# Altium schematic symbol library Regulator_Linear.SchLib: 1452 symbols (part 1 of 10) (continued)
## AP2127N-2.5
designator *  value AP2127N-2.5
ki_keywords: linear regulator ldo fixed positive; ki_description: 300mA low dropout linear regulator, shutdown pin, 2.5V-6V input voltage, 2.5V fixed positive output, SOT-23 package; ki_fp_filters: SOT?23*; Footprint: Package_TO_SOT_SMD:SOT-23; Supplier: https://www.diodes.com/assets/Datasheets/AP2127.pdf
footprint SOT-23
pins: 1 GND (power), 2 VO (power), 3 VI (power)

## AP2127N-2.8
designator *  value AP2127N-2.8
ki_keywords: linear regulator ldo fixed positive; ki_description: 300mA low dropout linear regulator, shutdown pin, 2.5V-6V input voltage, 2.8V fixed positive output, SOT-23 package; ki_fp_filters: SOT?23*; Footprint: Package_TO_SOT_SMD:SOT-23; Supplier: https://www.diodes.com/assets/Datasheets/AP2127.pdf
footprint SOT-23
pins: 1 GND (power), 2 VO (power), 3 VI (power)

## AP2127N-3.0
designator *  value AP2127N-3.0
ki_keywords: linear regulator ldo fixed positive; ki_description: 300mA low dropout linear regulator, shutdown pin, 2.5V-6V input voltage, 3.0V fixed positive output, SOT-23 package; ki_fp_filters: SOT?23*; Footprint: Package_TO_SOT_SMD:SOT-23; Supplier: https://www.diodes.com/assets/Datasheets/AP2127.pdf
footprint SOT-23
pins: 1 GND (power), 2 VO (power), 3 VI (power)

## AP2127N-3.3
designator *  value AP2127N-3.3
ki_keywords: linear regulator ldo fixed positive; ki_description: 300mA low dropout linear regulator, shutdown pin, 2.5V-6V input voltage, 3.3V fixed positive output, SOT-23 package; ki_fp_filters: SOT?23*; Footprint: Package_TO_SOT_SMD:SOT-23; Supplier: https://www.diodes.com/assets/Datasheets/AP2127.pdf
footprint SOT-23
pins: 1 GND (power), 2 VO (power), 3 VI (power)

## AP2127R-3.3
designator *  value AP2127R-3.3
ki_keywords: linear regulator ldo fixed positive; ki_description: 300mA low dropout linear regulator, shutdown pin, 2.5V-6V input voltage, 3.3V fixed positive output, SOT-89 package; ki_fp_filters: SOT?89*; Footprint: Package_TO_SOT_SMD:SOT-89-3; Supplier: https://www.diodes.com/assets/Datasheets/AP2127.pdf
footprint SOT-89-3
pins: 1 GND (power), 2 VI (power), 3 VO (power)

## AP2204K-1.5
designator *  value AP2204K-1.5
ki_keywords: linear regulator ldo fixed positive; ki_description: 150mA low dropout linear regulator, wide input voltage range, 1.5V fixed positive output, SOT-23-5; ki_fp_filters: SOT?23?5*; Footprint: Package_TO_SOT_SMD:SOT-23-5; Supplier: https://www.diodes.com/assets/Datasheets/AP2204.pdf
footprint SOT-23-5
pins: 1 VIN (power), 2 GND (power), 3 EN (in), 4 NC (in) hidden, 5 VOUT (power)

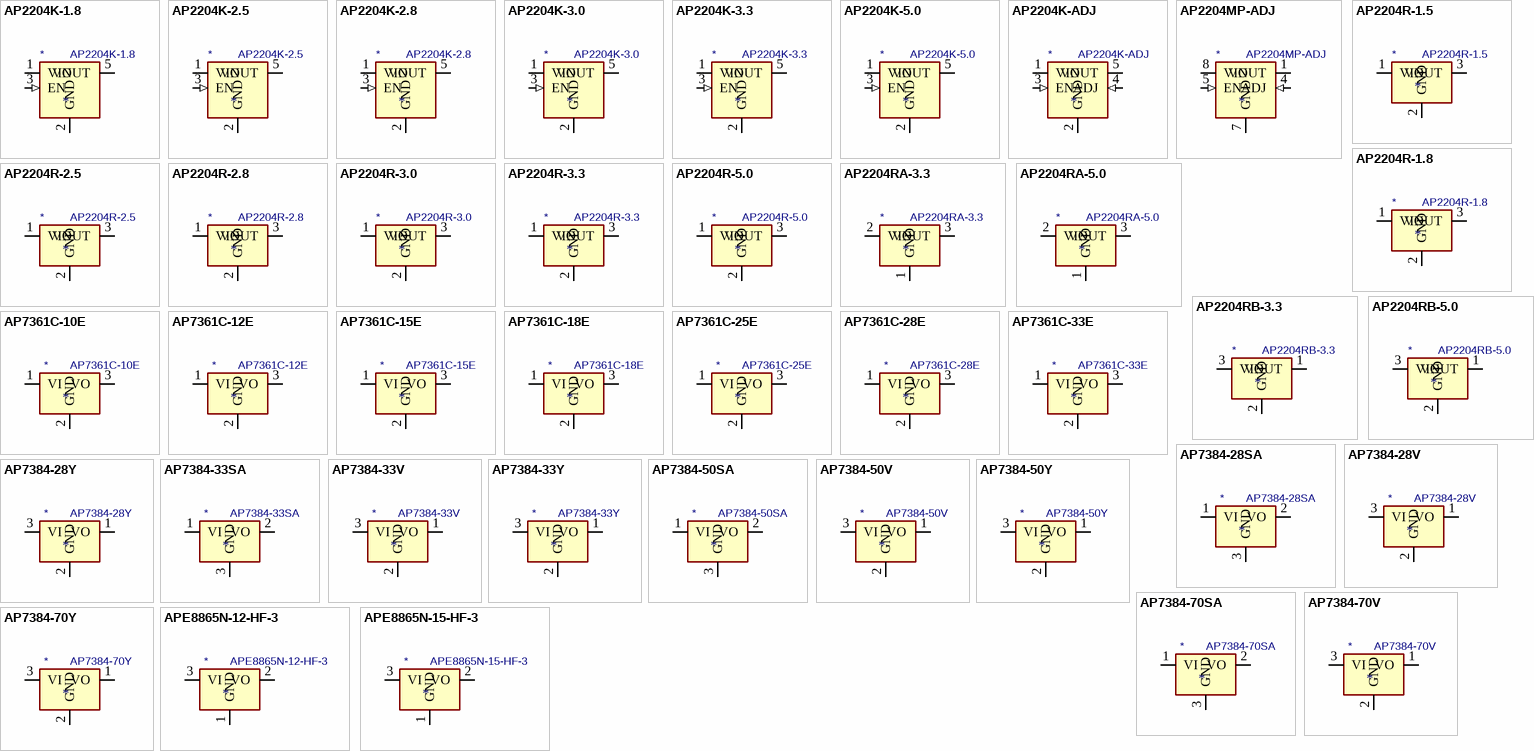
[diagram p2: symbols AP2204K-1.8 to APE8865N-15-HF-3]

## AP2204K-1.8
designator *  value AP2204K-1.8
ki_keywords: linear regulator ldo fixed positive; ki_description: 150mA low dropout linear regulator, wide input voltage range, 1.8V fixed positive output, SOT-23-5; ki_fp_filters: SOT?23?5*; Footprint: Package_TO_SOT_SMD:SOT-23-5; Supplier: https://www.diodes.com/assets/Datasheets/AP2204.pdf
footprint SOT-23-5
pins: 1 VIN (power), 2 GND (power), 3 EN (in), 4 NC (in) hidden, 5 VOUT (power)

## AP2204K-2.5
designator *  value AP2204K-2.5
ki_keywords: linear regulator ldo fixed positive; ki_description: 150mA low dropout linear regulator, wide input voltage range, 2.5V fixed positive output, SOT-23-5; ki_fp_filters: SOT?23?5*; Footprint: Package_TO_SOT_SMD:SOT-23-5; Supplier: https://www.diodes.com/assets/Datasheets/AP2204.pdf
footprint SOT-23-5
pins: 1 VIN (power), 2 GND (power), 3 EN (in), 4 NC (in) hidden, 5 VOUT (power)

## AP2204K-2.8
designator *  value AP2204K-2.8
ki_keywords: linear regulator ldo fixed positive; ki_description: 150mA low dropout linear regulator, wide input voltage range, 2.8V fixed positive output, SOT-23-5; ki_fp_filters: SOT?23?5*; Footprint: Package_TO_SOT_SMD:SOT-23-5; Supplier: https://www.diodes.com/assets/Datasheets/AP2204.pdf
footprint SOT-23-5
pins: 1 VIN (power), 2 GND (power), 3 EN (in), 4 NC (in) hidden, 5 VOUT (power)

## AP2204K-3.0
designator *  value AP2204K-3.0
ki_keywords: linear regulator ldo fixed positive; ki_description: 150mA low dropout linear regulator, wide input voltage range, 3.0V fixed positive output, SOT-23-5; ki_fp_filters: SOT?23?5*; Footprint: Package_TO_SOT_SMD:SOT-23-5; Supplier: https://www.diodes.com/assets/Datasheets/AP2204.pdf
footprint SOT-23-5
pins: 1 VIN (power), 2 GND (power), 3 EN (in), 4 NC (in) hidden, 5 VOUT (power)

## AP2204K-3.3
designator *  value AP2204K-3.3
ki_keywords: linear regulator ldo fixed positive; ki_description: 150mA low dropout linear regulator, wide input voltage range, 3.3V fixed positive output, SOT-23-5; ki_fp_filters: SOT?23?5*; Footprint: Package_TO_SOT_SMD:SOT-23-5; Supplier: https://www.diodes.com/assets/Datasheets/AP2204.pdf
footprint SOT-23-5
pins: 1 VIN (power), 2 GND (power), 3 EN (in), 4 NC (in) hidden, 5 VOUT (power)

## AP2204K-5.0
designator *  value AP2204K-5.0
ki_keywords: linear regulator ldo fixed positive; ki_description: 150mA low dropout linear regulator, wide input voltage range, 5.0V fixed positive output, SOT-23-5; ki_fp_filters: SOT?23?5*; Footprint: Package_TO_SOT_SMD:SOT-23-5; Supplier: https://www.diodes.com/assets/Datasheets/AP2204.pdf
footprint SOT-23-5
pins: 1 VIN (power), 2 GND (power), 3 EN (in), 4 NC (in) hidden, 5 VOUT (power)

## AP2204K-ADJ
designator *  value AP2204K-ADJ
ki_keywords: linear regulator ldo adjustable positive; ki_description: 150mA low dropout adjustable linear regulator, wide input voltage range, SOT-23-5 package; ki_fp_filters: SOT?23?5*; Footprint: Package_TO_SOT_SMD:SOT-23-5; Supplier: https://www.diodes.com/assets/Datasheets/AP2204.pdf
footprint SOT-23-5
pins: 1 VIN (power), 2 GND (power), 3 EN (in), 4 ADJ (in), 5 VOUT (power)

## AP2204MP-ADJ
designator *  value AP2204MP-ADJ
ki_keywords: linear regulator ldo adjustable positive; ki_description: 150mA low dropout adjustable linear regulator, wide input voltage range, PSOP-8 package; ki_fp_filters: Diodes*PSOP*; Footprint: Package_SO:Diodes_PSOP-8; Supplier: https://www.diodes.com/assets/Datasheets/AP2204.pdf
footprint Diodes_PSOP-8
pins: 1 VOUT (power), 2 NC (in) hidden, 3 NC (in) hidden, 4 ADJ (in), 5 EN (in), 6 NC (in) hidden, 7 GND (power), 8 VIN (power), 9 GND hidden

## AP2204R-1.5
designator *  value AP2204R-1.5
ki_keywords: linear regulator ldo fixed positive; ki_description: 150mA low dropout linear regulator, wide input voltage range, 1.5V fixed positive output, SOT-89-3 package; ki_fp_filters: SOT?89*; Footprint: Package_TO_SOT_SMD:SOT-89-3; Supplier: https://www.diodes.com/assets/Datasheets/AP2204.pdf
footprint SOT-89-3
pins: 1 VIN (power), 2 GND (power), 3 VOUT (power)

## AP2204R-1.8
designator *  value AP2204R-1.8
ki_keywords: linear regulator ldo fixed positive; ki_description: 150mA low dropout linear regulator, wide input voltage range, 1.8V fixed positive output, SOT-89-3 package; ki_fp_filters: SOT?89*; Footprint: Package_TO_SOT_SMD:SOT-89-3; Supplier: https://www.diodes.com/assets/Datasheets/AP2204.pdf
footprint SOT-89-3
pins: 1 VIN (power), 2 GND (power), 3 VOUT (power)

## AP2204R-2.5
designator *  value AP2204R-2.5
ki_keywords: linear regulator ldo fixed positive; ki_description: 150mA low dropout linear regulator, wide input voltage range, 2.5V fixed positive output, SOT-89-3 package; ki_fp_filters: SOT?89*; Footprint: Package_TO_SOT_SMD:SOT-89-3; Supplier: https://www.diodes.com/assets/Datasheets/AP2204.pdf
footprint SOT-89-3
pins: 1 VIN (power), 2 GND (power), 3 VOUT (power)

## AP2204R-2.8
designator *  value AP2204R-2.8
ki_keywords: linear regulator ldo fixed positive; ki_description: 150mA low dropout linear regulator, wide input voltage range, 2.8V fixed positive output, SOT-89-3 package; ki_fp_filters: SOT?89*; Footprint: Package_TO_SOT_SMD:SOT-89-3; Supplier: https://www.diodes.com/assets/Datasheets/AP2204.pdf
footprint SOT-89-3
pins: 1 VIN (power), 2 GND (power), 3 VOUT (power)

## AP2204R-3.0
designator *  value AP2204R-3.0
ki_keywords: linear regulator ldo fixed positive; ki_description: 150mA low dropout linear regulator, wide input voltage range, 3.0V fixed positive output, SOT-89-3 package; ki_fp_filters: SOT?89*; Footprint: Package_TO_SOT_SMD:SOT-89-3; Supplier: https://www.diodes.com/assets/Datasheets/AP2204.pdf
footprint SOT-89-3
pins: 1 VIN (power), 2 GND (power), 3 VOUT (power)

## AP2204R-3.3
designator *  value AP2204R-3.3
ki_keywords: linear regulator ldo fixed positive; ki_description: 150mA low dropout linear regulator, wide input voltage range, 3.3V fixed positive output, SOT-89-3 package; ki_fp_filters: SOT?89*; Footprint: Package_TO_SOT_SMD:SOT-89-3; Supplier: https://www.diodes.com/assets/Datasheets/AP2204.pdf
footprint SOT-89-3
pins: 1 VIN (power), 2 GND (power), 3 VOUT (power)

## AP2204R-5.0
designator *  value AP2204R-5.0
ki_keywords: linear regulator ldo fixed positive; ki_description: 150mA low dropout linear regulator, wide input voltage range, 5.0V fixed positive output, SOT-89-3 package; ki_fp_filters: SOT?89*; Footprint: Package_TO_SOT_SMD:SOT-89-3; Supplier: https://www.diodes.com/assets/Datasheets/AP2204.pdf
footprint SOT-89-3
pins: 1 VIN (power), 2 GND (power), 3 VOUT (power)

## AP2204RA-3.3
designator *  value AP2204RA-3.3
ki_keywords: linear regulator ldo fixed positive; ki_description: 150mA low dropout linear regulator, wide input voltage range, 3.3V fixed positive output, SOT-89-3 package; ki_fp_filters: SOT?89*; Footprint: Package_TO_SOT_SMD:SOT-89-3; Supplier: https://www.diodes.com/assets/Datasheets/AP2204.pdf
footprint SOT-89-3
pins: 1 GND (power), 2 VIN (power), 3 VOUT (power)

## AP2204RA-5.0
designator *  value AP2204RA-5.0
ki_keywords: linear regulator ldo fixed positive; ki_description: 150mA low dropout linear regulator, wide input voltage range, 5.0V fixed positive output, SOT-89-3 package; ki_fp_filters: SOT?89*; Footprint: Package_TO_SOT_SMD:SOT-89-3; Supplier: https://www.diodes.com/assets/Datasheets/AP2204.pdf
footprint SOT-89-3
pins: 1 GND (power), 2 VIN (power), 3 VOUT (power)

## AP2204RB-3.3
designator *  value AP2204RB-3.3
ki_keywords: linear regulator ldo fixed positive; ki_description: 150mA low dropout linear regulator, wide input voltage range, 3.3V fixed positive output, SOT-89-3 package; ki_fp_filters: SOT?89*; Footprint: Package_TO_SOT_SMD:SOT-89-3; Supplier: https://www.diodes.com/assets/Datasheets/AP2204.pdf
footprint SOT-89-3
pins: 1 VOUT (power), 2 GND (power), 3 VIN (power)

## AP2204RB-5.0
designator *  value AP2204RB-5.0
ki_keywords: linear regulator ldo fixed positive; ki_description: 150mA low dropout linear regulator, wide input voltage range, 5.0V fixed positive output, SOT-89-3 package; ki_fp_filters: SOT?89*; Footprint: Package_TO_SOT_SMD:SOT-89-3; Supplier: https://www.diodes.com/assets/Datasheets/AP2204.pdf
footprint SOT-89-3
pins: 1 VOUT (power), 2 GND (power), 3 VIN (power)

## AP7361C-10E
designator *  value AP7361C-10E
ki_keywords: linear regulator ldo fixed positive; ki_description: 1A Low Dropout regulator, positive, 1.0V fixed output, SOT-223; ki_fp_filters: SOT?223*; Footprint: Package_TO_SOT_SMD:SOT-223-3_TabPin2; Supplier: https://www.diodes.com/assets/Datasheets/AP7361C.pdf
footprint SOT-223-3_TabPin2
pins: 1 VI (power), 2 GND (power), 3 VO (power)

## AP7361C-12E
designator *  value AP7361C-12E
ki_keywords: linear regulator ldo fixed positive; ki_description: 1A Low Dropout regulator, positive, 1.2V fixed output, SOT-223; ki_fp_filters: SOT?223*; Footprint: Package_TO_SOT_SMD:SOT-223-3_TabPin2; Supplier: https://www.diodes.com/assets/Datasheets/AP7361C.pdf
footprint SOT-223-3_TabPin2
pins: 1 VI (power), 2 GND (power), 3 VO (power)

## AP7361C-15E
designator *  value AP7361C-15E
ki_keywords: linear regulator ldo fixed positive; ki_description: 1A Low Dropout regulator, positive, 1.5V fixed output, SOT-223; ki_fp_filters: SOT?223*; Footprint: Package_TO_SOT_SMD:SOT-223-3_TabPin2; Supplier: https://www.diodes.com/assets/Datasheets/AP7361C.pdf
footprint SOT-223-3_TabPin2
pins: 1 VI (power), 2 GND (power), 3 VO (power)

## AP7361C-18E
designator *  value AP7361C-18E
ki_keywords: linear regulator ldo fixed positive; ki_description: 1A Low Dropout regulator, positive, 1.8V fixed output, SOT-223; ki_fp_filters: SOT?223*; Footprint: Package_TO_SOT_SMD:SOT-223-3_TabPin2; Supplier: https://www.diodes.com/assets/Datasheets/AP7361C.pdf
footprint SOT-223-3_TabPin2
pins: 1 VI (power), 2 GND (power), 3 VO (power)

## AP7361C-25E
designator *  value AP7361C-25E
ki_keywords: linear regulator ldo fixed positive; ki_description: 1A Low Dropout regulator, positive, 2.5V fixed output, SOT-223; ki_fp_filters: SOT?223*; Footprint: Package_TO_SOT_SMD:SOT-223-3_TabPin2; Supplier: https://www.diodes.com/assets/Datasheets/AP7361C.pdf
footprint SOT-223-3_TabPin2
pins: 1 VI (power), 2 GND (power), 3 VO (power)

## AP7361C-28E
designator *  value AP7361C-28E
ki_keywords: linear regulator ldo fixed positive; ki_description: 1A Low Dropout regulator, positive, 2.8V fixed output, SOT-223; ki_fp_filters: SOT?223*; Footprint: Package_TO_SOT_SMD:SOT-223-3_TabPin2; Supplier: https://www.diodes.com/assets/Datasheets/AP7361C.pdf
footprint SOT-223-3_TabPin2
pins: 1 VI (power), 2 GND (power), 3 VO (power)

## AP7361C-33E
designator *  value AP7361C-33E
ki_keywords: linear regulator ldo fixed positive; ki_description: 1A Low Dropout regulator, positive, 3.3V fixed output, SOT-223; ki_fp_filters: SOT?223*; Footprint: Package_TO_SOT_SMD:SOT-223-3_TabPin2; Supplier: https://www.diodes.com/assets/Datasheets/AP7361C.pdf
footprint SOT-223-3_TabPin2
pins: 1 VI (power), 2 GND (power), 3 VO (power)

## AP7384-28SA
designator *  value AP7384-28SA
ki_keywords: 50mA LDO Regulator Fixed Positive; ki_description: 50mA Low Dropout Voltage Regulator, Fixed Output 2.8V, Wide Input Voltage Range 40V, SOT-23; ki_fp_filters: SOT?23*; Footprint: Package_TO_SOT_SMD:SOT-23; Supplier: https://www.diodes.com/assets/Datasheets/AP7384.pdf
footprint SOT-23
pins: 1 VI (power), 2 VO (power), 3 GND (power)

## AP7384-28V
designator *  value AP7384-28V
ki_keywords: 50mA LDO Regulator Fixed Positive; ki_description: 50mA Low Dropout Voltage Regulator, Fixed Output 2.8V, Wide Input Voltage Range 40V, TO-92; ki_fp_filters: TO?92*; Footprint: Package_TO_SOT_THT:TO-92_Inline_Wide; Supplier: https://www.diodes.com/assets/Datasheets/AP7384.pdf
footprint TO-92_Inline_Wide
pins: 1 VO (power), 2 GND (power), 3 VI (power)

## AP7384-28Y
designator *  value AP7384-28Y
ki_keywords: 50mA LDO Regulator Fixed Positive; ki_description: 50mA Low Dropout Voltage Regulator, Fixed Output 2.8V, Wide Input Voltage Range 40V, SOT-89-3; ki_fp_filters: SOT?89?3*; Footprint: Package_TO_SOT_SMD:SOT-89-3; Supplier: https://www.diodes.com/assets/Datasheets/AP7384.pdf
footprint SOT-89-3
pins: 1 VO (power), 2 GND (power), 3 VI (power)

## AP7384-33SA
designator *  value AP7384-33SA
ki_keywords: 50mA LDO Regulator Fixed Positive; ki_description: 50mA Low Dropout Voltage Regulator, Fixed Output 3.3V, Wide Input Voltage Range 40V, SOT-23; ki_fp_filters: SOT?23*; Footprint: Package_TO_SOT_SMD:SOT-23; Supplier: https://www.diodes.com/assets/Datasheets/AP7384.pdf
footprint SOT-23
pins: 1 VI (power), 2 VO (power), 3 GND (power)

## AP7384-33V
designator *  value AP7384-33V
ki_keywords: 50mA LDO Regulator Fixed Positive; ki_description: 50mA Low Dropout Voltage Regulator, Fixed Output 3.3V, Wide Input Voltage Range 40V, TO-92; ki_fp_filters: TO?92*; Footprint: Package_TO_SOT_THT:TO-92_Inline_Wide; Supplier: https://www.diodes.com/assets/Datasheets/AP7384.pdf
footprint TO-92_Inline_Wide
pins: 1 VO (power), 2 GND (power), 3 VI (power)

## AP7384-33Y
designator *  value AP7384-33Y
ki_keywords: 50mA LDO Regulator Fixed Positive; ki_description: 50mA Low Dropout Voltage Regulator, Fixed Output 3.3V, Wide Input Voltage Range 40V, SOT-89-3; ki_fp_filters: SOT?89?3*; Footprint: Package_TO_SOT_SMD:SOT-89-3; Supplier: https://www.diodes.com/assets/Datasheets/AP7384.pdf
footprint SOT-89-3
pins: 1 VO (power), 2 GND (power), 3 VI (power)

## AP7384-50SA
designator *  value AP7384-50SA
ki_keywords: 50mA LDO Regulator Fixed Positive; ki_description: 50mA Low Dropout Voltage Regulator, Fixed Output 5V, Wide Input Voltage Range 40V, SOT-23; ki_fp_filters: SOT?23*; Footprint: Package_TO_SOT_SMD:SOT-23; Supplier: https://www.diodes.com/assets/Datasheets/AP7384.pdf
footprint SOT-23
pins: 1 VI (power), 2 VO (power), 3 GND (power)

## AP7384-50V
designator *  value AP7384-50V
ki_keywords: 50mA LDO Regulator Fixed Positive; ki_description: 50mA Low Dropout Voltage Regulator, Fixed Output 5V, Wide Input Voltage Range 40V, TO-92; ki_fp_filters: TO?92*; Footprint: Package_TO_SOT_THT:TO-92_Inline_Wide; Supplier: https://www.diodes.com/assets/Datasheets/AP7384.pdf
footprint TO-92_Inline_Wide
pins: 1 VO (power), 2 GND (power), 3 VI (power)

## AP7384-50Y
designator *  value AP7384-50Y
ki_keywords: 50mA LDO Regulator Fixed Positive; ki_description: 50mA Low Dropout Voltage Regulator, Fixed Output 5V, Wide Input Voltage Range 40V, SOT-89-3; ki_fp_filters: SOT?89?3*; Footprint: Package_TO_SOT_SMD:SOT-89-3; Supplier: https://www.diodes.com/assets/Datasheets/AP7384.pdf
footprint SOT-89-3
pins: 1 VO (power), 2 GND (power), 3 VI (power)

## AP7384-70SA
designator *  value AP7384-70SA
ki_keywords: 50mA LDO Regulator Fixed Positive; ki_description: 50mA Low Dropout Voltage Regulator, Fixed Output 7V, Wide Input Voltage Range 40V, SOT-23; ki_fp_filters: SOT?23*; Footprint: Package_TO_SOT_SMD:SOT-23; Supplier: https://www.diodes.com/assets/Datasheets/AP7384.pdf
footprint SOT-23
pins: 1 VI (power), 2 VO (power), 3 GND (power)

## AP7384-70V
designator *  value AP7384-70V
ki_keywords: 50mA LDO Regulator Fixed Positive; ki_description: 50mA Low Dropout Voltage Regulator, Fixed Output 7V, Wide Input Voltage Range 40V, TO-92; ki_fp_filters: TO?92*; Footprint: Package_TO_SOT_THT:TO-92_Inline_Wide; Supplier: https://www.diodes.com/assets/Datasheets/AP7384.pdf
footprint TO-92_Inline_Wide
pins: 1 VO (power), 2 GND (power), 3 VI (power)

## AP7384-70Y
designator *  value AP7384-70Y
ki_keywords: 50mA LDO Regulator Fixed Positive; ki_description: 50mA Low Dropout Voltage Regulator, Fixed Output 7V, Wide Input Voltage Range 40V, SOT-89-3; ki_fp_filters: SOT?89?3*; Footprint: Package_TO_SOT_SMD:SOT-89-3; Supplier: https://www.diodes.com/assets/Datasheets/AP7384.pdf
footprint SOT-89-3
pins: 1 VO (power), 2 GND (power), 3 VI (power)

## APE8865N-12-HF-3
designator *  value APE8865N-12-HF-3
ki_keywords: 300mA LDO Regulator Fixed Positive; ki_description: 300mA Low Dropout Voltage Regulator, Fixed Output 1.2V, SOT-23; ki_fp_filters: SOT?23*; Footprint: Package_TO_SOT_SMD:SOT-23; Supplier: http://www.tme.eu/fr/Document/ced3461ed31ea70a3c416fb648e0cde7/APE8865-3.pdf
footprint SOT-23
pins: 1 GND (power), 2 VO (power), 3 VI (power)

## APE8865N-15-HF-3
designator *  value APE8865N-15-HF-3
ki_keywords: 300mA LDO Regulator Fixed Positive; ki_description: 300mA Low Dropout Voltage Regulator, Fixed Output 1.5V, SOT-23; ki_fp_filters: SOT?23*; Footprint: Package_TO_SOT_SMD:SOT-23; Supplier: http://www.tme.eu/fr/Document/ced3461ed31ea70a3c416fb648e0cde7/APE8865-3.pdf
footprint SOT-23
pins: 1 GND (power), 2 VO (power), 3 VI (power)

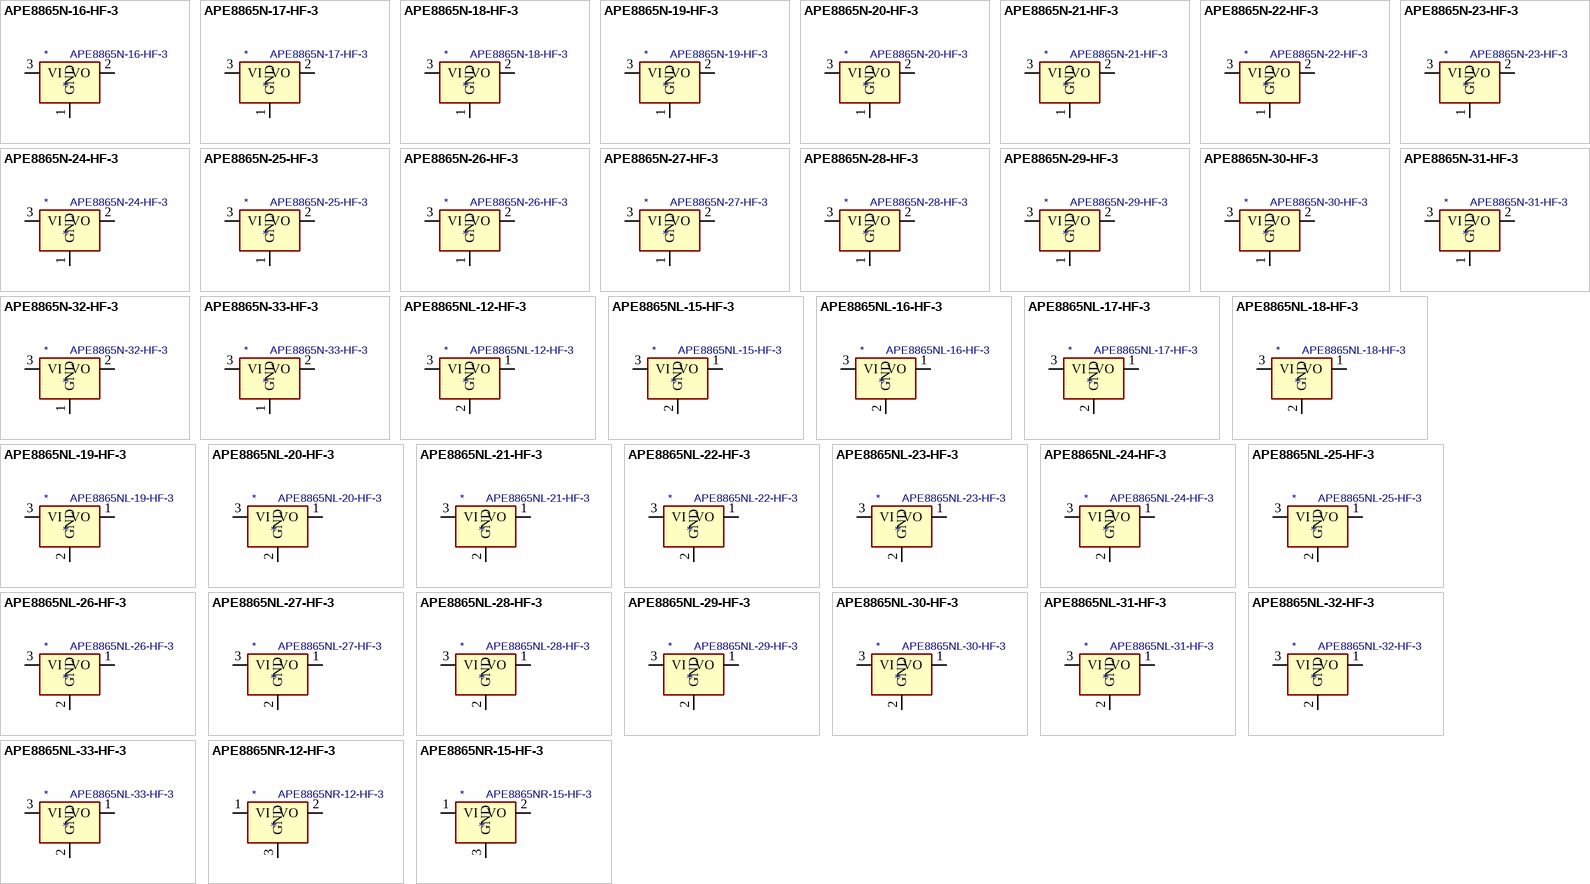
[diagram p3: symbols APE8865N-16-HF-3 to APE8865NR-15-HF-3]

## APE8865N-16-HF-3
designator *  value APE8865N-16-HF-3
ki_keywords: 300mA LDO Regulator Fixed Positive; ki_description: 300mA Low Dropout Voltage Regulator, Fixed Output 1.6V, SOT-23; ki_fp_filters: SOT?23*; Footprint: Package_TO_SOT_SMD:SOT-23; Supplier: http://www.tme.eu/fr/Document/ced3461ed31ea70a3c416fb648e0cde7/APE8865-3.pdf
footprint SOT-23
pins: 1 GND (power), 2 VO (power), 3 VI (power)

## APE8865N-17-HF-3
designator *  value APE8865N-17-HF-3
ki_keywords: 300mA LDO Regulator Fixed Positive; ki_description: 300mA Low Dropout Voltage Regulator, Fixed Output 1.7V, SOT-23; ki_fp_filters: SOT?23*; Footprint: Package_TO_SOT_SMD:SOT-23; Supplier: http://www.tme.eu/fr/Document/ced3461ed31ea70a3c416fb648e0cde7/APE8865-3.pdf
footprint SOT-23
pins: 1 GND (power), 2 VO (power), 3 VI (power)

## APE8865N-18-HF-3
designator *  value APE8865N-18-HF-3
ki_keywords: 300mA LDO Regulator Fixed Positive; ki_description: 300mA Low Dropout Voltage Regulator, Fixed Output 1.8V, SOT-23; ki_fp_filters: SOT?23*; Footprint: Package_TO_SOT_SMD:SOT-23; Supplier: http://www.tme.eu/fr/Document/ced3461ed31ea70a3c416fb648e0cde7/APE8865-3.pdf
footprint SOT-23
pins: 1 GND (power), 2 VO (power), 3 VI (power)

## APE8865N-19-HF-3
designator *  value APE8865N-19-HF-3
ki_keywords: 300mA LDO Regulator Fixed Positive; ki_description: 300mA Low Dropout Voltage Regulator, Fixed Output 1.9V, SOT-23; ki_fp_filters: SOT?23*; Footprint: Package_TO_SOT_SMD:SOT-23; Supplier: http://www.tme.eu/fr/Document/ced3461ed31ea70a3c416fb648e0cde7/APE8865-3.pdf
footprint SOT-23
pins: 1 GND (power), 2 VO (power), 3 VI (power)

## APE8865N-20-HF-3
designator *  value APE8865N-20-HF-3
ki_keywords: 300mA LDO Regulator Fixed Positive; ki_description: 300mA Low Dropout Voltage Regulator, Fixed Output 2.0V, SOT-23; ki_fp_filters: SOT?23*; Footprint: Package_TO_SOT_SMD:SOT-23; Supplier: http://www.tme.eu/fr/Document/ced3461ed31ea70a3c416fb648e0cde7/APE8865-3.pdf
footprint SOT-23
pins: 1 GND (power), 2 VO (power), 3 VI (power)

## APE8865N-21-HF-3
designator *  value APE8865N-21-HF-3
ki_keywords: 300mA LDO Regulator Fixed Positive; ki_description: 300mA Low Dropout Voltage Regulator, Fixed Output 2.1V, SOT-23; ki_fp_filters: SOT?23*; Footprint: Package_TO_SOT_SMD:SOT-23; Supplier: http://www.tme.eu/fr/Document/ced3461ed31ea70a3c416fb648e0cde7/APE8865-3.pdf
footprint SOT-23
pins: 1 GND (power), 2 VO (power), 3 VI (power)

## APE8865N-22-HF-3
designator *  value APE8865N-22-HF-3
ki_keywords: 300mA LDO Regulator Fixed Positive; ki_description: 300mA Low Dropout Voltage Regulator, Fixed Output 2.2V, SOT-23; ki_fp_filters: SOT?23*; Footprint: Package_TO_SOT_SMD:SOT-23; Supplier: http://www.tme.eu/fr/Document/ced3461ed31ea70a3c416fb648e0cde7/APE8865-3.pdf
footprint SOT-23
pins: 1 GND (power), 2 VO (power), 3 VI (power)

## APE8865N-23-HF-3
designator *  value APE8865N-23-HF-3
ki_keywords: 300mA LDO Regulator Fixed Positive; ki_description: 300mA Low Dropout Voltage Regulator, Fixed Output 2.3V, SOT-23; ki_fp_filters: SOT?23*; Footprint: Package_TO_SOT_SMD:SOT-23; Supplier: http://www.tme.eu/fr/Document/ced3461ed31ea70a3c416fb648e0cde7/APE8865-3.pdf
footprint SOT-23
pins: 1 GND (power), 2 VO (power), 3 VI (power)

## APE8865N-24-HF-3
designator *  value APE8865N-24-HF-3
ki_keywords: 300mA LDO Regulator Fixed Positive; ki_description: 300mA Low Dropout Voltage Regulator, Fixed Output 2.4V, SOT-23; ki_fp_filters: SOT?23*; Footprint: Package_TO_SOT_SMD:SOT-23; Supplier: http://www.tme.eu/fr/Document/ced3461ed31ea70a3c416fb648e0cde7/APE8865-3.pdf
footprint SOT-23
pins: 1 GND (power), 2 VO (power), 3 VI (power)

## APE8865N-25-HF-3
designator *  value APE8865N-25-HF-3
ki_keywords: 300mA LDO Regulator Fixed Positive; ki_description: 300mA Low Dropout Voltage Regulator, Fixed Output 2.5V, SOT-23; ki_fp_filters: SOT?23*; Footprint: Package_TO_SOT_SMD:SOT-23; Supplier: http://www.tme.eu/fr/Document/ced3461ed31ea70a3c416fb648e0cde7/APE8865-3.pdf
footprint SOT-23
pins: 1 GND (power), 2 VO (power), 3 VI (power)

## APE8865N-26-HF-3
designator *  value APE8865N-26-HF-3
ki_keywords: 300mA LDO Regulator Fixed Positive; ki_description: 300mA Low Dropout Voltage Regulator, Fixed Output 2.6V, SOT-23; ki_fp_filters: SOT?23*; Footprint: Package_TO_SOT_SMD:SOT-23; Supplier: http://www.tme.eu/fr/Document/ced3461ed31ea70a3c416fb648e0cde7/APE8865-3.pdf
footprint SOT-23
pins: 1 GND (power), 2 VO (power), 3 VI (power)

## APE8865N-27-HF-3
designator *  value APE8865N-27-HF-3
ki_keywords: 300mA LDO Regulator Fixed Positive; ki_description: 300mA Low Dropout Voltage Regulator, Fixed Output 2.7V, SOT-23; ki_fp_filters: SOT?23*; Footprint: Package_TO_SOT_SMD:SOT-23; Supplier: http://www.tme.eu/fr/Document/ced3461ed31ea70a3c416fb648e0cde7/APE8865-3.pdf
footprint SOT-23
pins: 1 GND (power), 2 VO (power), 3 VI (power)

## APE8865N-28-HF-3
designator *  value APE8865N-28-HF-3
ki_keywords: 300mA LDO Regulator Fixed Positive; ki_description: 300mA Low Dropout Voltage Regulator, Fixed Output 2.8V, SOT-23; ki_fp_filters: SOT?23*; Footprint: Package_TO_SOT_SMD:SOT-23; Supplier: http://www.tme.eu/fr/Document/ced3461ed31ea70a3c416fb648e0cde7/APE8865-3.pdf
footprint SOT-23
pins: 1 GND (power), 2 VO (power), 3 VI (power)

## APE8865N-29-HF-3
designator *  value APE8865N-29-HF-3
ki_keywords: 300mA LDO Regulator Fixed Positive; ki_description: 300mA Low Dropout Voltage Regulator, Fixed Output 2.9V, SOT-23; ki_fp_filters: SOT?23*; Footprint: Package_TO_SOT_SMD:SOT-23; Supplier: http://www.tme.eu/fr/Document/ced3461ed31ea70a3c416fb648e0cde7/APE8865-3.pdf
footprint SOT-23
pins: 1 GND (power), 2 VO (power), 3 VI (power)

## APE8865N-30-HF-3
designator *  value APE8865N-30-HF-3
ki_keywords: 300mA LDO Regulator Fixed Positive; ki_description: 300mA Low Dropout Voltage Regulator, Fixed Output 3.0V, SOT-23; ki_fp_filters: SOT?23*; Footprint: Package_TO_SOT_SMD:SOT-23; Supplier: http://www.tme.eu/fr/Document/ced3461ed31ea70a3c416fb648e0cde7/APE8865-3.pdf
footprint SOT-23
pins: 1 GND (power), 2 VO (power), 3 VI (power)

## APE8865N-31-HF-3
designator *  value APE8865N-31-HF-3
ki_keywords: 300mA LDO Regulator Fixed Positive; ki_description: 300mA Low Dropout Voltage Regulator, Fixed Output 3.1V, SOT-23; ki_fp_filters: SOT?23*; Footprint: Package_TO_SOT_SMD:SOT-23; Supplier: http://www.tme.eu/fr/Document/ced3461ed31ea70a3c416fb648e0cde7/APE8865-3.pdf
footprint SOT-23
pins: 1 GND (power), 2 VO (power), 3 VI (power)

## APE8865N-32-HF-3
designator *  value APE8865N-32-HF-3
ki_keywords: 300mA LDO Regulator Fixed Positive; ki_description: 300mA Low Dropout Voltage Regulator, Fixed Output 3.2V, SOT-23; ki_fp_filters: SOT?23*; Footprint: Package_TO_SOT_SMD:SOT-23; Supplier: http://www.tme.eu/fr/Document/ced3461ed31ea70a3c416fb648e0cde7/APE8865-3.pdf
footprint SOT-23
pins: 1 GND (power), 2 VO (power), 3 VI (power)

## APE8865N-33-HF-3
designator *  value APE8865N-33-HF-3
ki_keywords: 300mA LDO Regulator Fixed Positive; ki_description: 300mA Low Dropout Voltage Regulator, Fixed Output 3.3V, SOT-23; ki_fp_filters: SOT?23*; Footprint: Package_TO_SOT_SMD:SOT-23; Supplier: http://www.tme.eu/fr/Document/ced3461ed31ea70a3c416fb648e0cde7/APE8865-3.pdf
footprint SOT-23
pins: 1 GND (power), 2 VO (power), 3 VI (power)

## APE8865NL-12-HF-3
designator *  value APE8865NL-12-HF-3
ki_keywords: 300mA LDO Regulator Fixed Positive; ki_description: 300mA Low Dropout Voltage Regulator, Fixed Output 1.2V, SOT-23; ki_fp_filters: SOT?23*; Footprint: Package_TO_SOT_SMD:SOT-23; Supplier: http://www.tme.eu/fr/Document/ced3461ed31ea70a3c416fb648e0cde7/APE8865-3.pdf
footprint SOT-23
pins: 1 VO (power), 2 GND (power), 3 VI (power)

## APE8865NL-15-HF-3
designator *  value APE8865NL-15-HF-3
ki_keywords: 300mA LDO Regulator Fixed Positive; ki_description: 300mA Low Dropout Voltage Regulator, Fixed Output 1.5V, SOT-23; ki_fp_filters: SOT?23*; Footprint: Package_TO_SOT_SMD:SOT-23; Supplier: http://www.tme.eu/fr/Document/ced3461ed31ea70a3c416fb648e0cde7/APE8865-3.pdf
footprint SOT-23
pins: 1 VO (power), 2 GND (power), 3 VI (power)

## APE8865NL-16-HF-3
designator *  value APE8865NL-16-HF-3
ki_keywords: 300mA LDO Regulator Fixed Positive; ki_description: 300mA Low Dropout Voltage Regulator, Fixed Output 1.6V, SOT-23; ki_fp_filters: SOT?23*; Footprint: Package_TO_SOT_SMD:SOT-23; Supplier: http://www.tme.eu/fr/Document/ced3461ed31ea70a3c416fb648e0cde7/APE8865-3.pdf
footprint SOT-23
pins: 1 VO (power), 2 GND (power), 3 VI (power)

## APE8865NL-17-HF-3
designator *  value APE8865NL-17-HF-3
ki_keywords: 300mA LDO Regulator Fixed Positive; ki_description: 300mA Low Dropout Voltage Regulator, Fixed Output 1.7V, SOT-23; ki_fp_filters: SOT?23*; Footprint: Package_TO_SOT_SMD:SOT-23; Supplier: http://www.tme.eu/fr/Document/ced3461ed31ea70a3c416fb648e0cde7/APE8865-3.pdf
footprint SOT-23
pins: 1 VO (power), 2 GND (power), 3 VI (power)

## APE8865NL-18-HF-3
designator *  value APE8865NL-18-HF-3
ki_keywords: 300mA LDO Regulator Fixed Positive; ki_description: 300mA Low Dropout Voltage Regulator, Fixed Output 1.8V, SOT-23; ki_fp_filters: SOT?23*; Footprint: Package_TO_SOT_SMD:SOT-23; Supplier: http://www.tme.eu/fr/Document/ced3461ed31ea70a3c416fb648e0cde7/APE8865-3.pdf
footprint SOT-23
pins: 1 VO (power), 2 GND (power), 3 VI (power)

## APE8865NL-19-HF-3
designator *  value APE8865NL-19-HF-3
ki_keywords: 300mA LDO Regulator Fixed Positive; ki_description: 300mA Low Dropout Voltage Regulator, Fixed Output 1.9V, SOT-23; ki_fp_filters: SOT?23*; Footprint: Package_TO_SOT_SMD:SOT-23; Supplier: http://www.tme.eu/fr/Document/ced3461ed31ea70a3c416fb648e0cde7/APE8865-3.pdf
footprint SOT-23
pins: 1 VO (power), 2 GND (power), 3 VI (power)

## APE8865NL-20-HF-3
designator *  value APE8865NL-20-HF-3
ki_keywords: 300mA LDO Regulator Fixed Positive; ki_description: 300mA Low Dropout Voltage Regulator, Fixed Output 2.0V, SOT-23; ki_fp_filters: SOT?23*; Footprint: Package_TO_SOT_SMD:SOT-23; Supplier: http://www.tme.eu/fr/Document/ced3461ed31ea70a3c416fb648e0cde7/APE8865-3.pdf
footprint SOT-23
pins: 1 VO (power), 2 GND (power), 3 VI (power)

## APE8865NL-21-HF-3
designator *  value APE8865NL-21-HF-3
ki_keywords: 300mA LDO Regulator Fixed Positive; ki_description: 300mA Low Dropout Voltage Regulator, Fixed Output 2.1V, SOT-23; ki_fp_filters: SOT?23*; Footprint: Package_TO_SOT_SMD:SOT-23; Supplier: http://www.tme.eu/fr/Document/ced3461ed31ea70a3c416fb648e0cde7/APE8865-3.pdf
footprint SOT-23
pins: 1 VO (power), 2 GND (power), 3 VI (power)

## APE8865NL-22-HF-3
designator *  value APE8865NL-22-HF-3
ki_keywords: 300mA LDO Regulator Fixed Positive; ki_description: 300mA Low Dropout Voltage Regulator, Fixed Output 2.2V, SOT-23; ki_fp_filters: SOT?23*; Footprint: Package_TO_SOT_SMD:SOT-23; Supplier: http://www.tme.eu/fr/Document/ced3461ed31ea70a3c416fb648e0cde7/APE8865-3.pdf
footprint SOT-23
pins: 1 VO (power), 2 GND (power), 3 VI (power)

## APE8865NL-23-HF-3
designator *  value APE8865NL-23-HF-3
ki_keywords: 300mA LDO Regulator Fixed Positive; ki_description: 300mA Low Dropout Voltage Regulator, Fixed Output 2.3V, SOT-23; ki_fp_filters: SOT?23*; Footprint: Package_TO_SOT_SMD:SOT-23; Supplier: http://www.tme.eu/fr/Document/ced3461ed31ea70a3c416fb648e0cde7/APE8865-3.pdf
footprint SOT-23
pins: 1 VO (power), 2 GND (power), 3 VI (power)

## APE8865NL-24-HF-3
designator *  value APE8865NL-24-HF-3
ki_keywords: 300mA LDO Regulator Fixed Positive; ki_description: 300mA Low Dropout Voltage Regulator, Fixed Output 2.4V, SOT-23; ki_fp_filters: SOT?23*; Footprint: Package_TO_SOT_SMD:SOT-23; Supplier: http://www.tme.eu/fr/Document/ced3461ed31ea70a3c416fb648e0cde7/APE8865-3.pdf
footprint SOT-23
pins: 1 VO (power), 2 GND (power), 3 VI (power)

## APE8865NL-25-HF-3
designator *  value APE8865NL-25-HF-3
ki_keywords: 300mA LDO Regulator Fixed Positive; ki_description: 300mA Low Dropout Voltage Regulator, Fixed Output 2.5V, SOT-23; ki_fp_filters: SOT?23*; Footprint: Package_TO_SOT_SMD:SOT-23; Supplier: http://www.tme.eu/fr/Document/ced3461ed31ea70a3c416fb648e0cde7/APE8865-3.pdf
footprint SOT-23
pins: 1 VO (power), 2 GND (power), 3 VI (power)

## APE8865NL-26-HF-3
designator *  value APE8865NL-26-HF-3
ki_keywords: 300mA LDO Regulator Fixed Positive; ki_description: 300mA Low Dropout Voltage Regulator, Fixed Output 2.6V, SOT-23; ki_fp_filters: SOT?23*; Footprint: Package_TO_SOT_SMD:SOT-23; Supplier: http://www.tme.eu/fr/Document/ced3461ed31ea70a3c416fb648e0cde7/APE8865-3.pdf
footprint SOT-23
pins: 1 VO (power), 2 GND (power), 3 VI (power)

## APE8865NL-27-HF-3
designator *  value APE8865NL-27-HF-3
ki_keywords: 300mA LDO Regulator Fixed Positive; ki_description: 300mA Low Dropout Voltage Regulator, Fixed Output 2.7V, SOT-23; ki_fp_filters: SOT?23*; Footprint: Package_TO_SOT_SMD:SOT-23; Supplier: http://www.tme.eu/fr/Document/ced3461ed31ea70a3c416fb648e0cde7/APE8865-3.pdf
footprint SOT-23
pins: 1 VO (power), 2 GND (power), 3 VI (power)

## APE8865NL-28-HF-3
designator *  value APE8865NL-28-HF-3
ki_keywords: 300mA LDO Regulator Fixed Positive; ki_description: 300mA Low Dropout Voltage Regulator, Fixed Output 2.8V, SOT-23; ki_fp_filters: SOT?23*; Footprint: Package_TO_SOT_SMD:SOT-23; Supplier: http://www.tme.eu/fr/Document/ced3461ed31ea70a3c416fb648e0cde7/APE8865-3.pdf
footprint SOT-23
pins: 1 VO (power), 2 GND (power), 3 VI (power)

## APE8865NL-29-HF-3
designator *  value APE8865NL-29-HF-3
ki_keywords: 300mA LDO Regulator Fixed Positive; ki_description: 300mA Low Dropout Voltage Regulator, Fixed Output 2.9V, SOT-23; ki_fp_filters: SOT?23*; Footprint: Package_TO_SOT_SMD:SOT-23; Supplier: http://www.tme.eu/fr/Document/ced3461ed31ea70a3c416fb648e0cde7/APE8865-3.pdf
footprint SOT-23
pins: 1 VO (power), 2 GND (power), 3 VI (power)

## APE8865NL-30-HF-3
designator *  value APE8865NL-30-HF-3
ki_keywords: 300mA LDO Regulator Fixed Positive; ki_description: 300mA Low Dropout Voltage Regulator, Fixed Output 3.0V, SOT-23; ki_fp_filters: SOT?23*; Footprint: Package_TO_SOT_SMD:SOT-23; Supplier: http://www.tme.eu/fr/Document/ced3461ed31ea70a3c416fb648e0cde7/APE8865-3.pdf
footprint SOT-23
pins: 1 VO (power), 2 GND (power), 3 VI (power)

## APE8865NL-31-HF-3
designator *  value APE8865NL-31-HF-3
ki_keywords: 300mA LDO Regulator Fixed Positive; ki_description: 300mA Low Dropout Voltage Regulator, Fixed Output 3.1V, SOT-23; ki_fp_filters: SOT?23*; Footprint: Package_TO_SOT_SMD:SOT-23; Supplier: http://www.tme.eu/fr/Document/ced3461ed31ea70a3c416fb648e0cde7/APE8865-3.pdf
footprint SOT-23
pins: 1 VO (power), 2 GND (power), 3 VI (power)

## APE8865NL-32-HF-3
designator *  value APE8865NL-32-HF-3
ki_keywords: 300mA LDO Regulator Fixed Positive; ki_description: 300mA Low Dropout Voltage Regulator, Fixed Output 3.2V, SOT-23; ki_fp_filters: SOT?23*; Footprint: Package_TO_SOT_SMD:SOT-23; Supplier: http://www.tme.eu/fr/Document/ced3461ed31ea70a3c416fb648e0cde7/APE8865-3.pdf
footprint SOT-23
pins: 1 VO (power), 2 GND (power), 3 VI (power)

## APE8865NL-33-HF-3
designator *  value APE8865NL-33-HF-3
ki_keywords: 300mA LDO Regulator Fixed Positive; ki_description: 300mA Low Dropout Voltage Regulator, Fixed Output 3.3V, SOT-23; ki_fp_filters: SOT?23*; Footprint: Package_TO_SOT_SMD:SOT-23; Supplier: http://www.tme.eu/fr/Document/ced3461ed31ea70a3c416fb648e0cde7/APE8865-3.pdf
footprint SOT-23
pins: 1 VO (power), 2 GND (power), 3 VI (power)

## APE8865NR-12-HF-3
designator *  value APE8865NR-12-HF-3
ki_keywords: 300mA LDO Regulator Fixed Positive; ki_description: 300mA Low Dropout Voltage Regulator, Fixed Output 1.2V, SOT-23; ki_fp_filters: SOT?23*; Footprint: Package_TO_SOT_SMD:SOT-23; Supplier: http://www.tme.eu/fr/Document/ced3461ed31ea70a3c416fb648e0cde7/APE8865-3.pdf
footprint SOT-23
pins: 1 VI (power), 2 VO (power), 3 GND (power)